# Altium footprint library connector.PcbLib: 207 footprints (part 12 of 13)
Each footprint in its own frame and in the unit in brackets; x right, y up, seen from the top. Pads: shape width x height; smd on the part's side, far side on the other; paste and mask are expansions set on the pad; w line width, h text height; cw(c..) or ccw(c..) is an arc to the next point about the centre after c.
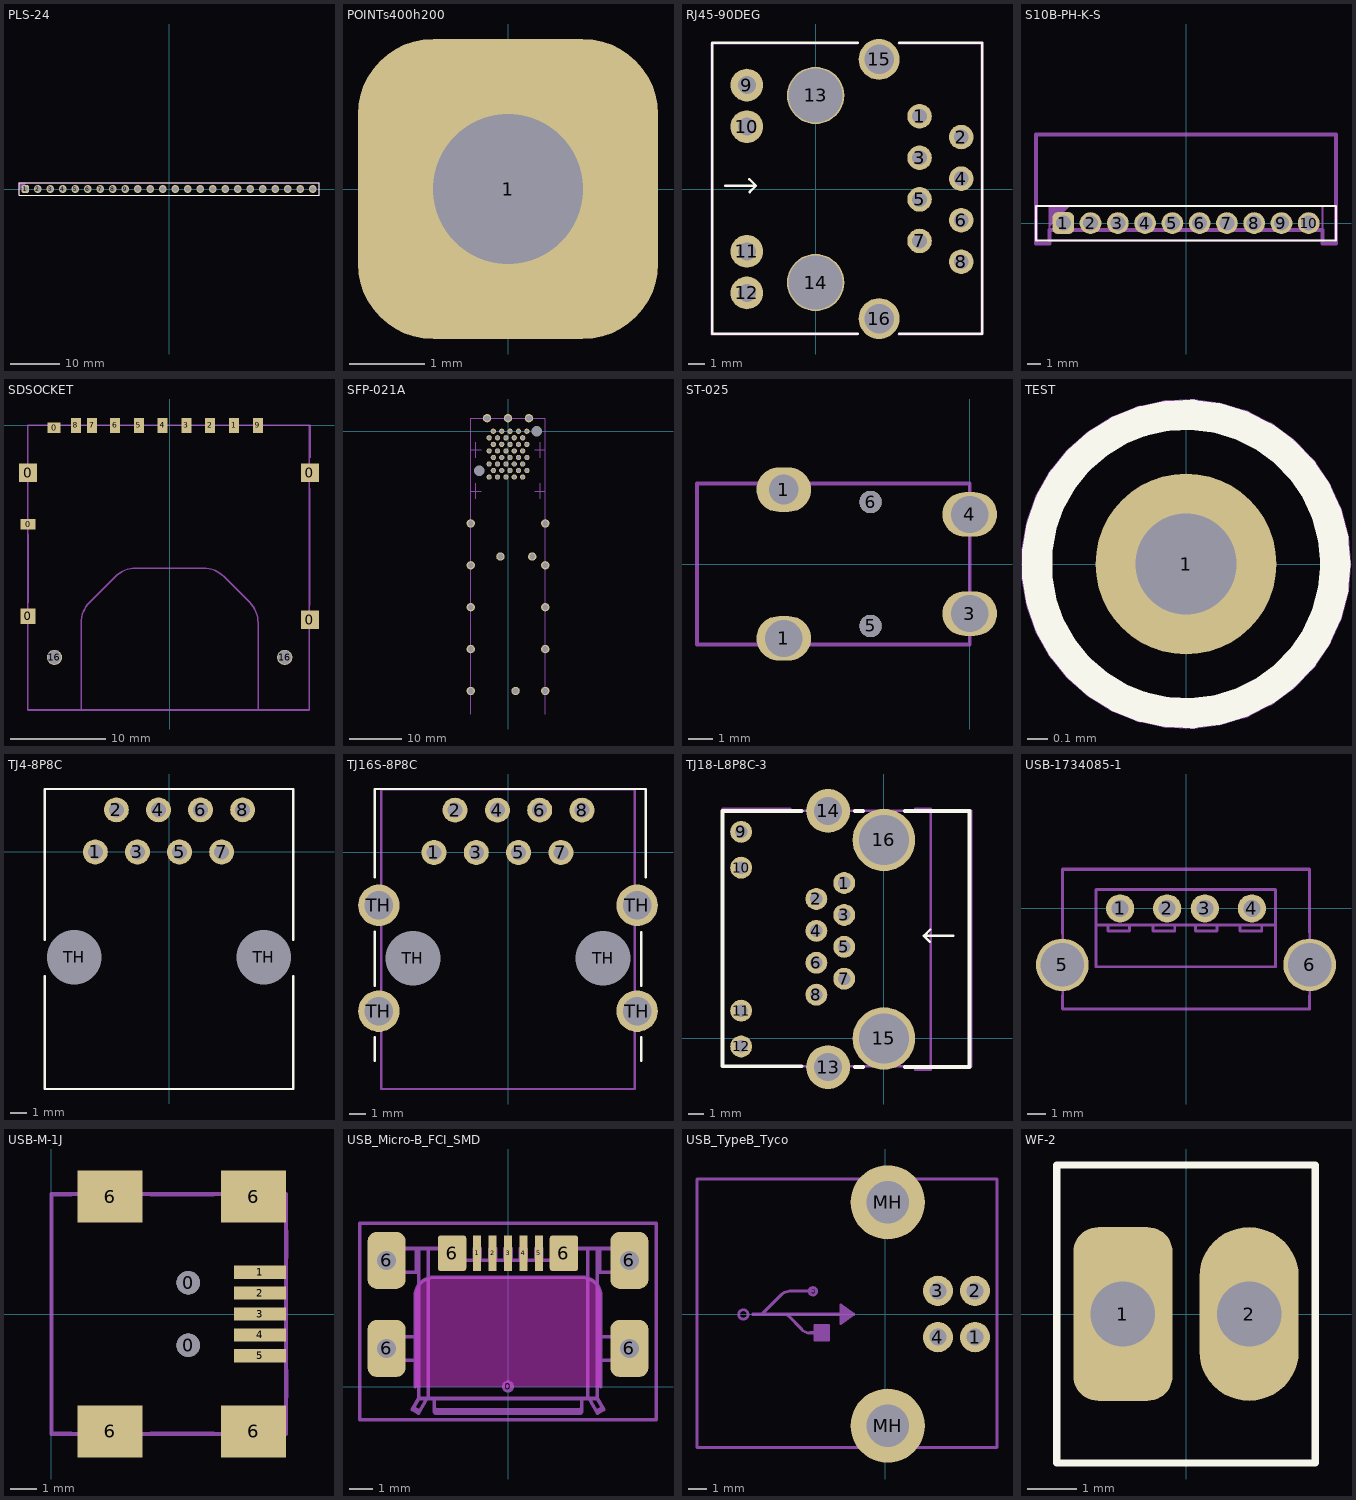
[diagram p11: the footprints below, top view; thin cyan lines are the x and y axes]

## PLS-24 [mm]
pads (24):
  rrect50% 1.6x1.6 hole 1.1: 1(-29.21,0)
  round 1.6 hole 1.1: 2(-26.67,0) 3(-24.13,0) 4(-21.59,0) 5(-19.05,0) 6(-16.51,0) 7(-13.97,0) 8(-11.43,0) 9(-8.89,0) 10(-6.35,0) 11(-3.81,0) 12(-1.27,0) 13(1.27,0) 14(3.81,0) 15(6.35,0) 16(8.89,0) 17(11.43,0) 18(13.97,0) 19(16.51,0) 20(19.05,0) 21(21.59,0) 22(24.13,0) 23(26.67,0) 24(29.21,0)
Top Overlay:
  lines w0.15: -30.48,-1.27 -30.48,1.27 30.48,1.27 30.48,-1.27 -30.48,-1.27
Mechanical 29:
  region: -30.48,1.27 -28.956,1.27 -30.48,-0.254
  lines w0.15: -30.48,-1.27 30.48,-1.27 30.48,1.27 -30.48,1.27 -30.48,-1.27
  text ".Designator" at -3.5,-0.3 h1
3D body "PLS-1.STEP": height 8.5, standoff -3, extent -30.48,-1.27 -27.94,1.27
3D body "PLS-1.STEP": height 8.5, standoff -3, extent -27.94,-1.27 -25.4,1.27
3D body "PLS-1.STEP": height 8.5, standoff -3, extent -25.4,-1.27 -22.86,1.27
3D body "PLS-1.STEP": height 8.5, standoff -3, extent -22.86,-1.27 -20.32,1.27
3D body "PLS-1.STEP": height 8.5, standoff -3, extent -20.32,-1.27 -17.78,1.27
3D body "PLS-1.STEP": height 8.5, standoff -3, extent -17.78,-1.27 -15.24,1.27
3D body "PLS-1.STEP": height 8.5, standoff -3, extent -15.24,-1.27 -12.7,1.27
3D body "PLS-1.STEP": height 8.5, standoff -3, extent -12.7,-1.27 -10.16,1.27
3D body "PLS-1.STEP": height 8.5, standoff -3, extent -10.16,-1.27 -7.62,1.27
3D body "PLS-1.STEP": height 8.5, standoff -3, extent -7.62,-1.27 -5.08,1.27
3D body "PLS-1.STEP": height 8.5, standoff -3, extent -5.08,-1.27 -2.54,1.27
3D body "PLS-1.STEP": height 8.5, standoff -3, extent -2.54,-1.27 0,1.27
3D body "PLS-1.STEP": height 8.5, standoff -3, extent 0,-1.27 2.54,1.27
3D body "PLS-1.STEP": height 8.5, standoff -3, extent 2.54,-1.27 5.08,1.27
3D body "PLS-1.STEP": height 8.5, standoff -3, extent 5.08,-1.27 7.62,1.27
3D body "PLS-1.STEP": height 8.5, standoff -3, extent 7.62,-1.27 10.16,1.27
3D body "PLS-1.STEP": height 8.5, standoff -3, extent 10.16,-1.27 12.7,1.27
3D body "PLS-1.STEP": height 8.5, standoff -3, extent 12.7,-1.27 15.24,1.27
3D body "PLS-1.STEP": height 8.5, standoff -3, extent 15.24,-1.27 17.78,1.27
3D body "PLS-1.STEP": height 8.5, standoff -3, extent 17.78,-1.27 20.32,1.27
3D body "PLS-1.STEP": height 8.5, standoff -3, extent 20.32,-1.27 22.86,1.27
3D body "PLS-1.STEP": height 8.5, standoff -3, extent 22.86,-1.27 25.4,1.27
3D body "PLS-1.STEP": height 8.5, standoff -3, extent 25.4,-1.27 27.94,1.27
3D body "PLS-1.STEP": height 8.5, standoff -3, extent 27.94,-1.27 30.48,1.27

## POINTs400h200 [mm]
pads (1):
  rrect50% 4x4 hole 2: 1(0,0)
Mechanical 29:
  text ".Designator" at -2,-0.5 h1

## RJ45-90DEG [mm]
height 16.3
pads (16):
  round 1.5 hole 0.9: 1(6.35,4.445) 2(8.89,3.175) 3(6.35,1.905) 4(8.89,0.635) 5(6.35,-0.635) 6(8.89,-1.905) 7(6.35,-3.175) 8(8.89,-4.445)
  round 2 hole 1.1: 9(-4.2,6.35) 10(-4.2,3.81) 11(-4.2,-3.81) 12(-4.2,-6.35)
  round 3.5 hole 3.3: 13(0,5.715) 14(0,-5.715)
  round 2.5 hole 1.8: 15(3.88,7.915) 16(3.88,-7.915)
Top Overlay:
  lines w0.15: -5.523,0.198 -4.392,0.198 -4.001,0.198 -3.648,0.198 ; -4.052,0.602 -3.648,0.198 ; -4.035,-0.19 -3.648,0.198 ; 2.565,-8.855 -6.325,-8.855 -6.325,8.925 2.565,8.925 ; 5.105,-8.855 10.185,-8.855 10.185,8.925 5.105,8.925
Mechanical 29:
  lines w0.15: 2.54,-8.89 -6.35,-8.89 -6.35,8.89 2.54,8.89 ; 5.08,-8.89 10.16,-8.89 10.16,8.89 5.08,8.89
  text ".Designator" at -3,-0.3 h1

## S10B-PH-K-S [mm]
pads (10):
  rrect50% 1.6x1.6 hole 1.1: 1(-9,0)
  round 1.6 hole 1.1: 2(-7,0) 3(-5,0) 4(-3,0) 5(-1,0) 6(1,0) 7(3,0) 8(5,0) 9(7,0) 10(9,0)
Top Overlay:
  lines w0.15: -11,-1.27 -11,1.27 11,1.27 11,-1.27 -11,-1.27
Top Courtyard:
  lines w0.3: -11,-1.5 -10,-1.5 -10,-0.5 0,-0.5 10,-0.5 10,-1.5 11,-1.5 11,6.5 0,6.5 -11,6.5 -11,-1.5
Mechanical 29:
  region: -10,1.27 -8.476,1.27 -10,-0.254
  lines w0.15: -10,-1.27 10,-1.27 10,1.27 -10,1.27 -10,-1.27
  text ".Designator" at -3.5,-0.8 h1
3D body "S10B-PH-K-S.STEP": height 4.8, standoff -3.4, extent -10.95,-1.25 10.95,6.35

## SDSOCKET [mm]
pads (17):
  rect 1.6x1.6 smd: 0(-14.87,-20.04)
  rect 1.6x1.1 smd: 0(-14.87,-10.37)
  rect 1.9x1.9 smd: 0(-14.87,-4.97) 0(14.75,-20.42) 0(14.75,-4.97)
  rect 1.35x1.1 smd: 0(-12.13,-0.23)
  rect 1.05x1.56 smd: 1(6.77,0) 2(4.27,0) 3(1.77,0) 4(-0.73,0) 5(-3.23,0) 6(-5.73,0) 7(-8.15,0) 8(-9.85,0) 9(9.27,0)
  round 1.6 hole 1.4: 16(-12.1,-24.37) 16(12.1,-24.37)
Mechanical 29:
  lines w0.15: -14.9,-21.475 -14.9,-29.875 14.7,-29.875 14.7,-22.1 ; -14.875,-9.225 -14.875,-6.225 ; -14.875,-3.375 -14.875,0 ; -14.85,-18.65 -14.85,-11.45 ; -13.25,0 -14.875,0 ; -9.3,-29.9 -9.3,-20.745 cw(c-6.234,-20.745) -8.402,-18.577 -5.723,-15.898 cw(c-3.555,-18.066) -3.555,-15 0,-15 3.555,-15 cw(c3.555,-18.066) 5.723,-15.898 8.402,-18.577 cw(c6.234,-20.745) 9.3,-20.745 9.3,-29.9 ; 10.2,0 14.775,0 14.775,-3.4 ; 14.725,-18.875 14.725,-6.6 ; -14.875,0 -14.875,-29.9 14.7,-29.9 14.7,0 -14.875,0
  text ".Designator" at -3.5,-10.3 h1
3D body "SDCARD.STEP": height 2.8, standoff -0.8, extent -13.925,-29.625 14.525,0.625

## SFP-021A [mm]
pads (58):
  round 1 hole 0.7: L1(-3.6,-3.75) L2(-2.8,-2.5) L3(-2,-3.75) L4(-1.2,-2.5) L5(-0.4,-3.75) L6(0.4,-2.5) L7(1.2,-3.75) L8(2,-2.5) L9(2.8,-3.75) L10(3.6,-2.5) L11(3.6,0) L12(2.8,-1.25) L13(2,0) L14(1.2,-1.25) L15(0.4,0) L16(-0.4,-1.25) L17(-1.2,0) L18(-2,-1.25) L19(-2.8,0) L20(-3.6,-1.25) T1(3.6,-5) T2(2.8,-6.25) T3(2,-5) T4(1.2,-6.25) T5(0.4,-5) T6(-0.4,-6.25) T7(-1.2,-5) T8(-2,-6.25) T9(-2.8,-5) T10(-3.6,-6.25) T11(-3.6,-8.75) T12(-2.8,-7.5) T13(-2,-8.75) T14(-1.2,-7.5) T15(-0.4,-8.75) T16(0.4,-7.5) T17(1.2,-8.75) T18(2,-7.5) T19(2.8,-8.75) T20(3.6,-7.5)
  round 1.6 hole 1.1: TH(-7.125,-49.6) TH(-7.125,-41.6) TH(-7.125,-33.6) TH(-7.125,-25.6) TH(-7.125,-17.6) TH(-4,2.5) TH(-1.45,-23.925) TH(0,2.5) TH(1.45,-49.6) TH(4,2.5) TH(4.625,-23.925) TH(7.125,-49.6) TH(7.125,-41.6) TH(7.125,-33.6) TH(7.125,-25.6) TH(7.125,-17.6)
  round 0 hole 2: TH(-5.5,-7.5) TH(5.5,0)
Mechanical 29:
  lines w0.15: -7.125,-54 -7.125,-49.6 -7.125,2.5 0,2.5 7.125,2.5 7.125,-49.6 7.125,-54 ; -7.125,-11.43 -5.125,-11.43 ; -7.125,-3.57 -5.125,-3.57 ; -6.125,-12.93 -6.125,-9.93 ; -6.125,-5.07 -6.125,-2.07 ; 5.125,-11.43 7.125,-11.43 ; 5.125,-3.57 7.125,-3.57 ; 6.125,-12.93 6.125,-9.93 ; 6.125,-5.07 6.125,-2.07
  text ".Designator" at -2.5,-19.3 h1

## ST-025 [mm] "3.5 mm PHONE JACKS (DIP Type)"
height 5
pads (6):
  oval 2.2x1.8 hole 1.5: 1(-7.5,-3) 3(0,-2) 4(0,2)
  oval 2.2x1.8 hole 1.2: 1(-7.5,3)
  round 0.9 hole 0.9: 5(-4,-2.5) 6(-4,2.5)
Mechanical 29:
  lines w0.15: -8.825,-3.25 -11,-3.25 ; -8.825,3.25 -11,3.25 ; -6.125,-3.25 0,-3.25 ; -6.125,3.25 0,3.25 ; 0,-0.775 0,0 0,0.775 ; -11,-3.25 -11,3.25 ; -11,-3.25 0,-3.25 ; -11,-3.25 -11,3.25 ; -11,3.25 0,3.25 ; 0,-3.25 0,3.25
  text ".Designator" at -9,-0.8 h1

## TEST [mm]
pads (1):
  round 0.9 hole 0.5 paste+0: 1(0,0)
Top Overlay:
  circle w0.15: c0,0 r0.742
Top Courtyard:
  circle w0.15: c0,0 r0.3
Mechanical 29:
  circle w0.15: c0,0 r0.746
  text ".Designator" at -1,1.2 h1

## TJ4-8P8C [mm]
height 11.5
pads (10):
  round 1.5 hole 0.9: 1(-4.445,0) 2(-3.175,2.54) 3(-1.905,0) 4(-0.635,2.54) 5(0.635,0) 6(1.905,2.54) 7(3.175,0) 8(4.445,2.54)
  round 1.5 hole 3.3 unplated: TH(-5.715,-6.35) TH(5.715,-6.35)
Top Overlay:
  lines w0.15: -7.5,-7.5 -7.5,-14.3 7.5,-14.3 7.5,-7.5 ; -7.5,-5.3 -7.5,3.8 0,3.8 7.5,3.8 7.5,-5.3
3D body "432028104.stp": height 11.58, standoff -3.56, extent -7.64,-14.317 7.6,3.717

## TJ16S-8P8C [mm]
height 13.6
pads (14):
  round 1.5 hole 0.9: 1(-4.445,0) 2(-3.175,2.54) 3(-1.905,0) 4(-0.635,2.54) 5(0.635,0) 6(1.905,2.54) 7(3.175,0) 8(4.445,2.54)
  round 2.5 hole 1.7: TH(-7.75,-9.525) TH(-7.75,-3.175) TH(7.75,-9.525) TH(7.75,-3.175)
  round 1.5 hole 3.3 unplated: TH(-5.715,-6.35) TH(5.715,-6.35)
Top Overlay:
  lines w0.15: -8,-12.5 -8,-11.1 ; -8,-8 -8,-4.75 ; -8,-1.5 -8,3.81 0,3.81 8.255,3.81 8.255,-1.5 ; 8,-12.5 8,-11.1 ; 8,-8 8,-4.8
Top Courtyard:
  lines w0.15: -7.6,-14.2 7.6,-14.2 7.6,3.8 -7.6,3.8 -7.6,-14.2
3D body "432028104.stp": height 11.58, standoff -3.56, extent -7.62,-14.2 7.62,3.834

## TJ18-L8P8C-3 [mm]
pads (16):
  round 1.4 hole 0.8: 1(-2.54,9.94) 2(-4.32,8.92) 3(-2.54,7.9) 4(-4.32,6.88) 5(-2.54,5.86) 6(-4.32,4.84) 7(-2.54,3.82) 8(-4.32,2.8) 9(-9.13,13.21) 10(-9.13,10.92) 11(-9.13,1.78) 12(-9.13,-0.51)
  round 2.8 hole 1.8: 13(-3.57,-1.83) 14(-3.57,14.55)
  round 4 hole 3.2: 15(0,0) 16(0,12.69)
Top Overlay:
  lines w0.15: 2.939,6.173 2.552,6.56 ; 2.956,6.964 2.552,6.56 ; 4.427,6.56 3.295,6.56 2.905,6.56 2.552,6.56
  lines w0.254: -5.275,-1.775 -10.325,-1.775 -10.325,14.55 -5.275,14.55 ; -1.84,-1.83 -1.325,-1.83 ; -1.84,14.55 -1.325,14.55 ; 1.35,-1.83 5.475,-1.83 5.475,14.55 1.35,14.55
Mechanical 29:
  lines w0.15: -6,-1.775 -10.325,-1.775 ; -6,14.7 -10.325,14.7 -10.325,-1.775 ; 2,-2 3,-2 3,14.7 2,14.7 ; -10.325,-1.775 5.6,-1.775 5.6,14.55 -10.325,14.55 -10.325,-1.775
  text ".Designator" at -7,5.7 h1
3D body "AMPHENOL_RJHSE-5381.stp": height 15.14, standoff -3.7, extent -10.503,-2 5.7,14.83

## USB-1734085-1 [mm]
pads (6):
  round 1.5 hole 0.9: 1(-3.5,0) 2(-1,0) 3(1,0) 4(3.5,0)
  round 2.8 hole 2.3: 5(-6.57,-3) 6(6.57,-3)
Mechanical 29:
  lines w0.15: -6.575,-1.325 -6.57,-1.325 -6.57,2.1 6.57,2.1 6.57,-1.275 ; -6.57,-4.625 -6.57,-5.35 6.55,-5.35 6.57,-5.33 6.57,-4.625 ; -4.15,-0.875 -4.15,-1.2 -3,-1.2 -3,-0.875 -2.975,-0.875 ; -1.75,-0.875 -1.75,-1.2 -0.6,-1.2 -0.6,-0.875 ; 0.5,-0.875 0.5,-1.2 1.65,-1.2 1.65,-0.875 ; 2.875,-0.875 2.875,-1.2 4.025,-1.2 4.025,-0.875 ; -4.775,-0.875 -4.775,-3.1 4.7,-3.1 4.75,-3.1 4.75,-0.875 ; -4.775,-0.875 -4.775,1 4.75,1 4.75,-0.875 ; -4.775,-0.875 4.75,-0.875 ; -6.55,-5.35 6.575,-5.35 6.575,2.075 -6.55,2.075 -6.55,-5.35
  text ".Designator" at -4,-4.8 h1
3D body "c-1734085-1-d.STEP": height 13.5, standoff -4.55, extent -7.625,-5.455 7.575,2.225

## USB-M-1J [mm]
height 4
pads (11):
  round 0.9 hole 0.9: 0(5.25,-1.2) 0(5.25,1.2)
  rect 2x0.5 smd: 1(8.001,1.6) 2(8.001,0.8) 3(8.001,0) 4(8.001,-0.8) 5(8.001,-1.6)
  rect 2.5x2 smd: 6(2.25,-4.5) 6(2.25,4.5) 6(7.75,-4.5) 6(7.75,4.5)
Mechanical 29:
  lines w0.15: 0.762,-4.572 0,-4.572 0,0 0,4.572 0.762,4.572 ; 3.81,-4.572 6.223,-4.572 ; 3.81,4.572 6.223,4.572 ; 9.017,-3.175 9.017,-2.159 ; 9.017,2.159 9.017,3.175 ; 0,-4.6 9,-4.6 9,4.6 0,4.6 0,-4.6
  text ".Designator" at 0.5,-0.3 h1

## USB_Micro-B_FCI_SMD [mm]
height 2.286
pads (12):
  round 0.508 on Mech15: 0(0,0)
  rrect20% 0.35x1.5 smd: 1(-1.3,5.6) 2(-0.65,5.6) 3(0,5.6) 4(0.65,5.6) 5(1.3,5.6)
  rrect50% 1.6x2.4 hole 0.8: 6(-5.1,1.6) 6(-5.1,5.3) 6(5.1,1.6) 6(5.1,5.3)
  rrect20% 1.2x1.5 smd: 6(-2.35,5.6) 6(2.35,5.6)
Top Solder:
  region: 1.905,4.826 1.905,6.35 -1.905,6.35 -1.905,4.826
Keep-Out Layer:
  board cut-out: -3.9,0 -3.9,3.797 -3.9,3.875 -3.869,4.03 -3.809,4.175 -3.721,4.307 -3.61,4.418 -3.479,4.505 -3.333,4.566 -3.179,4.597 -3.1,4.597 3.1,4.597 3.179,4.597 3.333,4.566 3.479,4.505 3.61,4.418 3.721,4.307 3.809,4.175 3.869,4.03 3.9,3.875 3.9,3.797 3.9,0
Mechanical 13:
  lines w0.15: -3.49,-0.651 ccw(c-3.75,-0.501) -3.45,-0.5 ; -3.1,-1.031 ccw(c-3.006,-1.024) -3,-1.118 ; -3.1,-0.881 ccw(c-3.006,-0.874) -3,-0.968 ; -2.577,5.8 cw(c-2.577,5.6) -2.443,5.748 ; -2.229,5.553 ccw(c-2.275,5.8) -2.024,5.8 ; -2.007,5.352 ccw(c-1.873,5.5) -1.873,5.3 ; 1.873,5.3 ccw(c1.873,5.5) 2.007,5.352 ; 2.024,5.8 ccw(c2.275,5.8) 2.229,5.553 ; 2.443,5.748 cw(c2.577,5.6) 2.577,5.8 ; 3,-1.118 ccw(c3.006,-1.024) 3.1,-1.031 ; 3,-0.968 ccw(c3.006,-0.874) 3.1,-0.881 ; 3.45,-0.5 ccw(c3.75,-0.501) 3.49,-0.651
Mechanical 15:
  lines w0.15: -3.9,0 -3.9,3.797 cw(c-3.1,3.797) -3.1,4.597 3.1,4.597 cw(c3.1,3.797) 3.9,3.797 3.9,0 ; -6.223,-1.397 -6.223,6.858 6.223,6.858 6.223,-1.397 -6.223,-1.397
Mechanical 29:
  lines w0.15: -4.85,1.1 -4.85,2.1 ; -4.85,4.8 -4.85,5.8 ; -3.97,-0.881 -3.71,-1.031 ; -3.85,1.1 -3.85,2.1 ; -3.85,4.8 -3.85,5.8 ; -3.75,1.1 -5.25,1.1 -5.25,2.1 -3.75,2.1 ; -3.75,4.8 -5.25,4.8 -5.25,5.8 -2.577,5.8 ; -3.75,5.8 -3.75,-0.5 ; -3.49,-0.651 -3.76,-1.118 -4.02,-0.968 -3.75,-0.5 ; -3.35,-0.5 -3.35,5.8 ; -3.1,-1.031 -3.1,-0.5 ; -2.526,5.793 -2.526,5.8 ; -2.443,5.748 -2.007,5.352 ; -1.873,5.3 1.873,5.3 ; -1.425,5.3 -1.425,5.8 -1.175,5.8 -1.175,5.3 ; -0.775,5.3 -0.775,5.8 -0.525,5.8 -0.525,5.3 ; -0.125,5.3 -0.125,5.8 0.125,5.8 0.125,5.3 ; 0.525,5.3 0.525,5.8 0.775,5.8 0.775,5.3 ; 1.175,5.3 1.175,5.8 1.425,5.8 1.425,5.3 ; 2.007,5.352 2.443,5.748 ; 2.526,5.793 2.526,5.8 ; 2.577,5.8 5.25,5.8 5.25,4.8 3.75,4.8 ; 3.1,-1.031 3.1,-0.5 ; 3.35,-0.5 3.35,5.8 ; 3.49,-0.651 3.76,-1.118 4.02,-0.968 3.75,-0.5 ; 3.71,-1.031 3.97,-0.881 ; 3.75,1.1 5.25,1.1 5.25,2.1 3.75,2.1 ; 3.75,5.8 3.75,-0.5 ; 3.85,1.1 3.85,2.1 ; 3.85,4.8 3.85,5.8 ; 4.85,1.1 4.85,2.1 ; 4.85,4.8 4.85,5.8 ; -3.75,-0.5 -3.1,-0.5 ; -3.1,-0.5 3.1,-0.501 ; 3.1,-0.5 3.75,-0.5 ; -3,-1.118 3,-1.118 3,-0.968 -3,-0.968 -3,-1.118
  text ".Designator" at -3,1.7 h1
3D body "Micro USB B-type mid-mount FCI.STEP": height 2.15, standoff -0.92, extent -5.25,-1.118 5.25,5.8
3D body "USB Micro B plug.STEP": height 4.67, standoff -3.53, extent -5.35,-21.579 5.35,2.921

## USB_TypeB_Tyco [mm]
height 11.1
pads (6):
  round 1.626 hole 0.914: 1(4.83,-1.25) 2(4.83,1.25) 3(2.83,1.25) 4(2.83,-1.25)
  round 4 hole 2.3: MH(0.12,-6.02) MH(0.12,6.02)
Mechanical 29:
  circle w0.15: c-3.91,1.225 r0.2
  circle w0.15: c-7.66,-0.025 r0.254
  region: -1.71,-0.025 -2.41,-0.525 -2.41,0.475
  region: -3.06,-1.4 -3.81,-1.4 -3.81,-0.65 -3.06,-0.65
  lines w0.15: -10.16,7.2 -10.16,-7.2 ; -7.16,-0.025 -2.41,-0.025 ; -7.16,0 -2.41,0 ; -6.613,0.037 -5.613,1.037 cw(c-5.16,0.585) -5.16,1.225 -3.91,1.225 ; -6.613,0.062 -5.613,1.062 ; -5.263,-0.087 -4.513,-0.837 ccw(c-4.06,-0.385) -4.06,-1.025 -3.81,-1.025 ; -5.263,-0.062 -4.513,-0.812 ; -5.16,1.25 -3.91,1.25 ; -4.06,-1 -3.81,-1 ; -2.16,-7.2 -10.16,-7.2 ; 2.34,-7.2 5.74,-7.2 ; -10.16,-7.2 6.015,-7.2 6.015,7.275 -10.16,7.275 -10.16,-7.2 ; -3.81,-1.4 -3.06,-1.4 -3.06,-0.65 -3.81,-0.65 -3.81,-1.4 ; -3.81,-1.375 -3.81,-0.625 -3.06,-0.625 -3.06,-1.375 -3.81,-1.375 ; -2.41,-0.525 -1.71,-0.025 -2.41,0.475 -2.41,-0.525 ; -2.41,-0.5 -1.71,0 -2.41,0.5 -2.41,-0.5
  text ".Designator" at -7.66,3.7 h1
3D body "User Library-JST_UBB-4R-D14T-4D.step": height 11.6, standoff -3.12, extent -10.16,-7.475 6.14,7.425

## WF-2 [mm]
pads (2):
  rrect50% 2x3.5 hole 1.3: 1(-1.27,0)
  oval 2x3.5 hole 1.3: 2(1.27,0)
Top Overlay:
  lines w0.15: -2.6,-3 2.6,-3 2.6,3 -2.6,3 -2.6,-3
3D body "SNP389.STEP": height 11.4, standoff -3.4, extent -2.54,-2.9 0,2.9
3D body "SNP389.STEP": height 11.4, standoff -3.4, extent 0,-2.9 2.54,2.9